# Altium footprint library andylib.PcbLib: 158 footprints (part 8 of 10)
Each footprint in its own frame and in the unit in brackets; x right, y up, seen from the top. Pads: shape width x height; smd on the part's side, far side on the other; paste and mask are expansions set on the pad; w line width, h text height; cw(c..) or ccw(c..) is an arc to the next point about the centre after c.
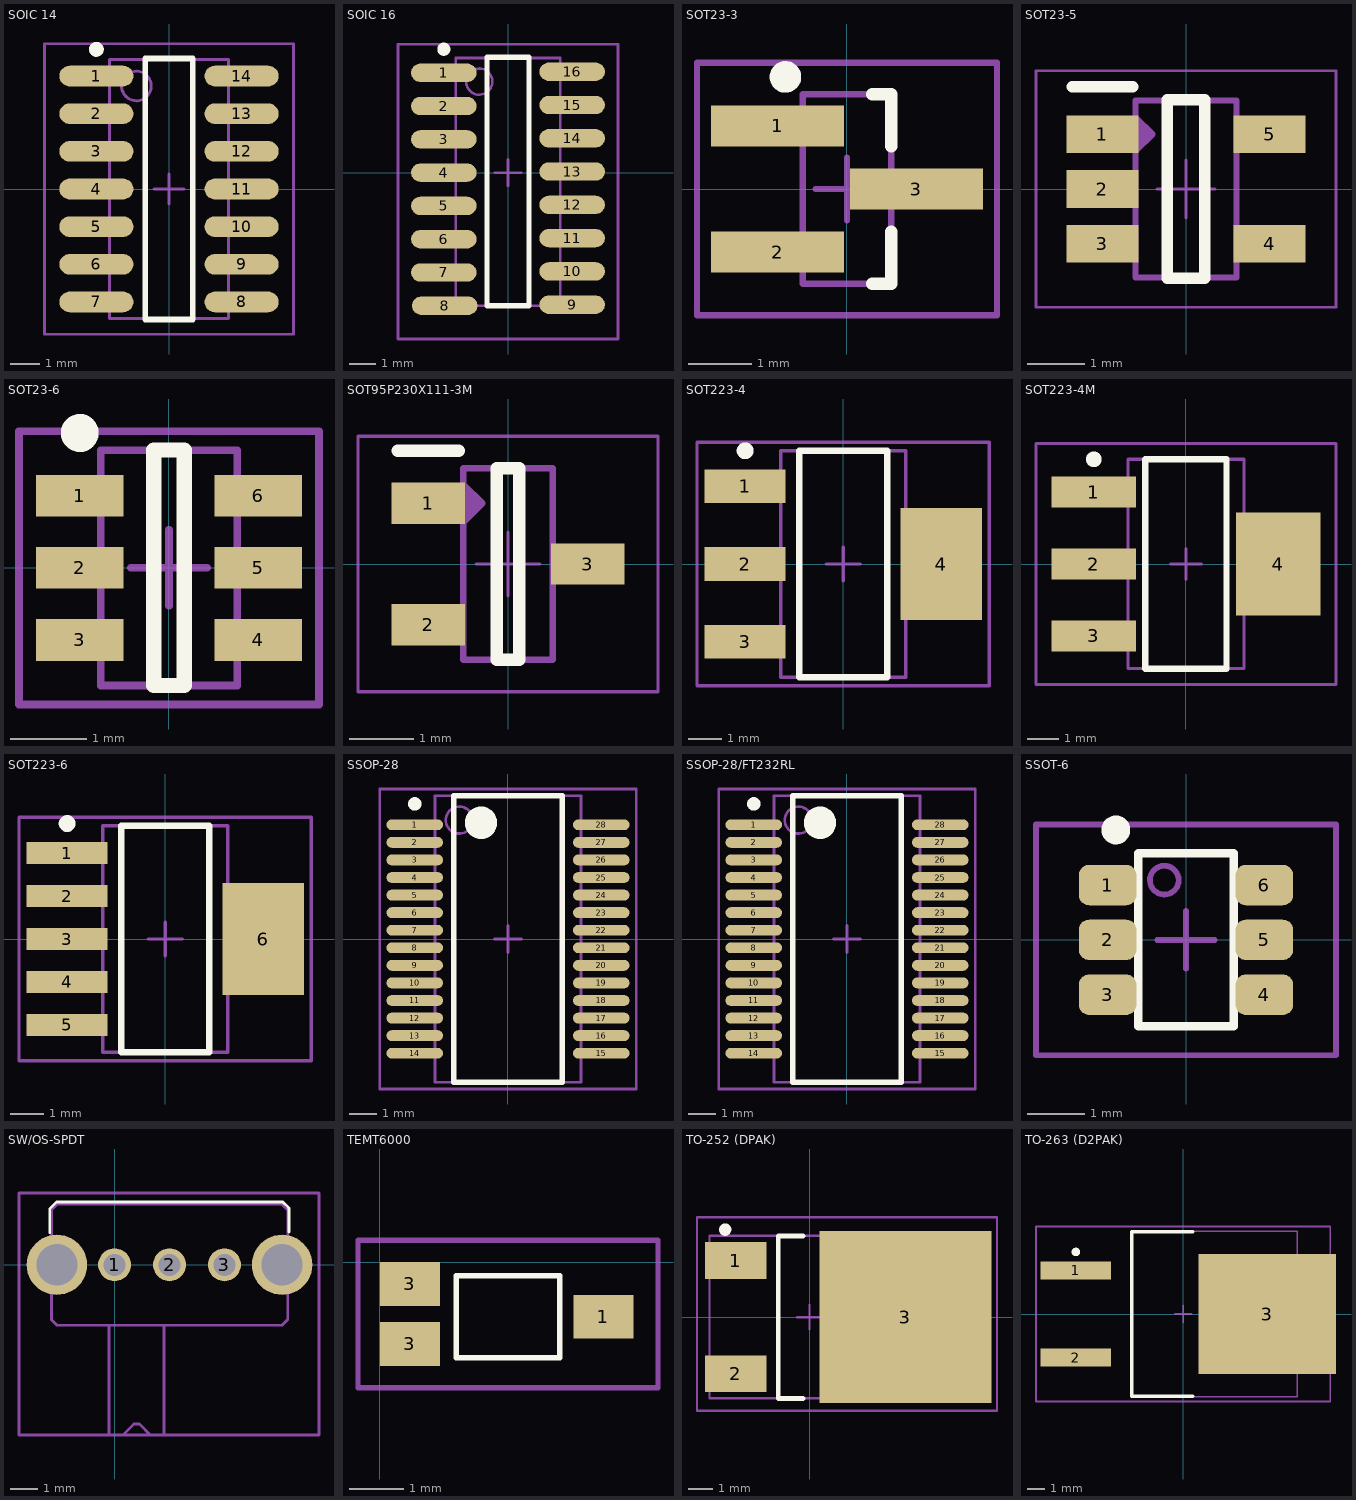
[diagram p7: the footprints below, top view; thin cyan lines are the x and y axes]

## SOIC 14 [mm] "14-Pin Small Outline Integrated Circuit 1.27 mm Pitch, IPC Low Density"
height 1.75
pads (14):
  oval 2.5x0.7 smd: 1(-2.45,3.81) 2(-2.45,2.54) 3(-2.45,1.27) 4(-2.45,0) 5(-2.45,-1.27) 6(-2.45,-2.54) 7(-2.45,-3.81) 8(2.45,-3.81) 9(2.45,-2.54) 10(2.45,-1.27) 11(2.45,0) 12(2.45,1.27) 13(2.45,2.54) 14(2.45,3.81)
Top Overlay:
  circle w0.25: c-2.45,4.71 r0.125
  lines w0.2: -0.8,-4.4 -0.8,4.4 0.8,4.4 0.8,-4.4 -0.8,-4.4
Mechanical 13:
  circle w0.1: c-1.1,3.475 r0.5
  lines w0.1: -2,-4.375 -2,4.375 2,4.375 2,-4.375 -2,-4.375
Mechanical 15:
  lines w0.1: -0.5,0 0.5,0 ; 0,-0.5 0,0.5 ; -4.2,-4.9 -4.2,4.9 4.2,4.9 4.2,-4.9 -4.2,-4.9
3D body: height 1.75, standoff 0, extent -3.048,-4.318 3.054,4.332

## SOIC 16 [mm] "14-Pin Small Outline Integrated Circuit 1.27 mm Pitch, IPC Low Density"
height 1.75
pads (16):
  oval 2.5x0.7 smd: 1(-2.45,3.81) 2(-2.45,2.54) 3(-2.45,1.27) 4(-2.45,0) 5(-2.45,-1.27) 6(-2.45,-2.54) 7(-2.45,-3.81) 8(-2.413,-5.08) 9(2.45,-5.04) 10(2.45,-3.77) 11(2.45,-2.5) 12(2.45,-1.23) 13(2.45,0.04) 14(2.45,1.31) 15(2.45,2.58) 16(2.45,3.85)
Top Overlay:
  circle w0.25: c-2.45,4.71 r0.125
  lines w0.2: -0.8,-5.08 -0.8,4.4 0.8,4.4 0.8,-5.08 -0.8,-5.08
Mechanical 13:
  circle w0.1: c-1.1,3.475 r0.5
  lines w0.1: -2,-5.08 -2,4.375 2,4.375 2,-5.08 -2,-5.08
Mechanical 15:
  lines w0.1: -0.5,0 0.5,0 ; 0,-0.5 0,0.5 ; -4.2,-6.35 -4.2,4.9 4.2,4.9 4.2,-6.35 -4.2,-6.35
3D body: height 1.75, standoff 0, extent -3.048,-4.318 3.054,4.332

## SOT23-3 [mm] "SOT23, 3-Leads, Body 3.0x2.6mm (max), Pitch 0.95mm, IPC Low Density"
height 1.1
pads (3):
  rect 2.1x0.65 smd: 1(-1.1,1) 2(-1.1,-1) 3(1.1,0)
Top Overlay:
  circle w0.25: c-0.975,1.775 r0.125
  lines w0.2: 0.4,-1.5 0.7,-1.5 0.7,-0.675 ; 0.4,1.5 0.7,1.5 0.7,0.675
Mechanical 13:
  lines w0.1: -0.7,-1.5 -0.7,1.5 0.7,1.5 0.7,-1.5 -0.7,-1.5
Mechanical 15:
  lines w0.1: -0.5,0 0.5,0 ; 0,-0.5 0,0.5 ; -2.375,-2 -2.375,2 2.375,2 2.375,-2 -2.375,-2
3D body: height 1.46, standoff 0, extent -1.575,-1.501 1.422,1.499

## SOT23-5 [mm] "SOT23, 5-Leads, Body 3.1x3.0mm (max), Pitch 0.95mm, IPC Low Density"
height 1
pads (5):
  rect 1.25x0.65 smd: 1(-1.45,0.95) 2(-1.45,0) 3(-1.45,-0.95) 4(1.45,-0.95) 5(1.45,0.95)
Top Overlay:
  lines w0.2: -1.975,1.775 -0.925,1.775 ; -0.325,-1.55 -0.325,1.55 0.325,1.55 0.325,-1.55 -0.325,-1.55
Mechanical 13:
  lines w0.1: -0.875,0.65 -0.575,0.95 -0.875,1.25 ; -0.875,0.75 -0.675,0.95 -0.875,1.15 ; -0.875,0.85 -0.775,0.95 -0.875,1.05 ; -0.875,-1.535 0.875,-1.535 0.875,1.535 -0.875,1.535 -0.875,-1.535
  text ".Designator" at 0.175,-0.85 h0.5
Mechanical 15:
  lines w0.05: -0.5,0 0.5,0 ; 0,-0.5 0,0.5 ; -2.6,-2.05 2.6,-2.05 2.6,2.05 -2.6,2.05 -2.6,-2.05
3D body: height 1.1, standoff 0, extent -1.25,-1.5 1.25,1.5

## SOT23-6 [mm] "SOT23, 6-Leads, Body 3.1x3.2mm (max), Pitch 0.95mm, IPC Medium Density"
height 1.45
pads (6):
  rect 1.15x0.55 smd: 1(-1.175,0.95) 2(-1.175,0) 3(-1.175,-0.95) 4(1.175,-0.95) 5(1.175,0) 6(1.175,0.95)
Top Overlay:
  circle w0.25: c-1.175,1.775 r0.125
  lines w0.2: -0.2,-1.55 0.2,-1.55 0.2,1.55 -0.2,1.55 -0.2,-1.55
Mechanical 13:
  lines w0.1: -0.9,-1.55 -0.9,1.55 0.9,1.55 0.9,-1.55 -0.9,-1.55
Mechanical 15:
  lines w0.1: -0.5,0 0.5,0 ; 0,-0.5 0,0.5 ; -1.975,-1.8 -1.975,1.8 1.975,1.8 1.975,-1.8 -1.975,-1.8
3D body: height 1.3, standoff 0, extent -1.499,-1.5 1.501,1.5

## SOT95P230X111-3M [mm] "SOT23, 3-Leads, Body 3.0x2.5mm (max), Pitch 0.95mm, IPC Low Density"
height 1.11
pads (3):
  rect 1.15x0.65 smd: 1(-1.25,0.95) 2(-1.25,-0.95) 3(1.25,0)
Top Overlay:
  lines w0.2: -1.725,1.775 -0.775,1.775 ; -0.175,-1.5 -0.175,1.5 0.175,1.5 0.175,-1.5 -0.175,-1.5
Mechanical 13:
  lines w0.1: -0.7,0.65 -0.4,0.95 -0.7,1.25 ; -0.7,0.75 -0.5,0.95 -0.7,1.15 ; -0.7,0.85 -0.6,0.95 -0.7,1.05 ; -0.7,-1.5 0.7,-1.5 0.7,1.5 -0.7,1.5 -0.7,-1.5
  text ".Designator" at 0.254,-0.635 h0.5
Mechanical 15:
  lines w0.05: -0.5,0 0.5,0 ; 0,-0.5 0,0.5 ; -2.35,-2 -2.35,2 2.35,2 2.35,-2 -2.35,-2
3D body: height 1, standoff 0, extent -1.2,-1.448 1.22,1.448

## SOT223-4 [mm] "SOT223, 4-Leads, Body 6.7x7.3mm (max), Pitch 2.30mm, IPC Medium Density"
height 1.8
pads (4):
  rect 2.4x1 smd: 1(-2.9,2.3) 2(-2.9,0) 3(-2.9,-2.3)
  rect 2.4x3.3 smd: 4(2.9,0)
Top Overlay:
  circle w0.25: c-2.9,3.35 r0.125
  lines w0.2: -1.3,-3.35 1.3,-3.35 1.3,3.35 -1.3,3.35 -1.3,-3.35
Mechanical 13:
  lines w0.1: -1.85,-3.35 1.85,-3.35 1.85,3.35 -1.85,3.35 -1.85,-3.35
Mechanical 15:
  lines w0.1: -0.5,0 0.5,0 ; 0,-0.5 0,0.5 ; -4.325,-3.6 4.325,-3.6 4.325,3.6 -4.325,3.6 -4.325,-3.6
3D body: height 1.64, standoff -0.01, extent -3.454,-3.225 3.546,3.275

## SOT223-4M [mm] "SOT223, 4-Leads, Body 6.5x3.5mm, Pitch 2.3mm, Lead Span 7mm, IPC Low Density"
height 1.7
pads (4):
  rect 2.7x1 smd: 1(-2.95,2.3) 2(-2.95,0) 3(-2.95,-2.3)
  rect 2.7x3.3 smd: 4(2.95,0)
Top Overlay:
  circle w0.25: c-2.95,3.35 r0.125
  lines w0.2: -1.3,-3.35 -1.3,3.35 1.3,3.35 1.3,-3.35 -1.3,-3.35
Mechanical 13:
  lines w0.1: -1.85,-3.35 -1.85,3.35 1.85,3.35 1.85,-3.35 -1.85,-3.35
Mechanical 15:
  lines w0.1: -0.5,0 0.5,0 ; 0,-0.5 0,0.5 ; -4.8,-3.85 -4.8,3.85 4.8,3.85 4.8,-3.85 -4.8,-3.85
3D body: height 1.7, standoff 0, extent -3.495,-3.25 3.395,3.25

## SOT223-6 [mm] "SOT223, 6-Leads, Body 6.7x7.3mm (max), Pitch 1.27mm, IPC Medium Density"
height 1.8
pads (6):
  rect 2.4x0.65 smd: 1(-2.9,2.54) 2(-2.9,1.27) 3(-2.9,0) 4(-2.9,-1.27) 5(-2.9,-2.54)
  rect 2.4x3.3 smd: 6(2.9,0)
Top Overlay:
  circle w0.25: c-2.9,3.415 r0.125
  lines w0.2: -1.3,-3.35 1.3,-3.35 1.3,3.35 -1.3,3.35 -1.3,-3.35
Mechanical 13:
  lines w0.1: -1.85,-3.35 1.85,-3.35 1.85,3.35 -1.85,3.35 -1.85,-3.35
Mechanical 15:
  lines w0.1: -0.5,0 0.5,0 ; 0,-0.5 0,0.5 ; -4.325,-3.6 4.325,-3.6 4.325,3.6 -4.325,3.6 -4.325,-3.6
3D body: height 1.7, standoff 0, extent -3.455,-3.249 3.505,3.251

## SSOP-28 [mm] "28-Pin SSOP 0.65 mm Pitch"
height 2
pads (28):
  oval 2.1x0.4 smd: 1(-3.45,4.225) 2(-3.45,3.575) 3(-3.45,2.925) 4(-3.45,2.275) 5(-3.45,1.625) 6(-3.45,0.975) 7(-3.45,0.325) 8(-3.45,-0.325) 9(-3.45,-0.975) 10(-3.45,-1.625) 11(-3.45,-2.275) 12(-3.45,-2.925) 13(-3.45,-3.575) 14(-3.45,-4.225) 15(3.45,-4.225) 16(3.45,-3.575) 17(3.45,-2.925) 18(3.45,-2.275) 19(3.45,-1.625) 20(3.45,-0.975) 21(3.45,-0.325) 22(3.45,0.325) 23(3.45,0.975) 24(3.45,1.625) 25(3.45,2.275) 26(3.45,2.925) 27(3.45,3.575) 28(3.45,4.225)
Top Overlay:
  circle w0.6: c-1,4.3 r0.3
  circle w0.25: c-3.45,5 r0.125
  lines w0.2: -2,-5.3 2,-5.3 2,5.3 -2,5.3 -2,-5.3
Mechanical 13:
  circle w0.1: c-1.8,4.4 r0.5
  lines w0.1: -2.7,-5.3 2.7,-5.3 2.7,5.3 -2.7,5.3 -2.7,-5.3
Mechanical 15:
  lines w0.1: -0.5,0 0.5,0 ; 0,-0.5 0,0.5 ; -4.75,-5.55 4.75,-5.55 4.75,5.55 -4.75,5.55 -4.75,-5.55
3D body: height 2.15, standoff 0, extent -3.827,-5.165 3.929,5.165

## SSOP-28/FT232RL [mm] "28-Pin SSOP 0.65 mm Pitch"
height 2
pads (28):
  oval 2.1x0.4 smd: 1(-3.45,4.225) 2(-3.45,3.575) 3(-3.45,2.925) 4(-3.45,2.275) 5(-3.45,1.625) 6(-3.45,0.975) 7(-3.45,0.325) 8(-3.45,-0.325) 9(-3.45,-0.975) 10(-3.45,-1.625) 11(-3.45,-2.275) 12(-3.45,-2.925) 13(-3.45,-3.575) 14(-3.45,-4.225) 15(3.45,-4.225) 16(3.45,-3.575) 17(3.45,-2.925) 18(3.45,-2.275) 19(3.45,-1.625) 20(3.45,-0.975) 21(3.45,-0.325) 22(3.45,0.325) 23(3.45,0.975) 24(3.45,1.625) 25(3.45,2.275) 26(3.45,2.925) 27(3.45,3.575) 28(3.45,4.225)
Top Overlay:
  circle w0.25: c-3.45,5 r0.125
  circle w0.6: c-1,4.3 r0.3
  lines w0.2: -2,-5.3 -2,5.3 2,5.3 2,-5.3 -2,-5.3
Mechanical 13:
  circle w0.1: c-1.8,4.4 r0.5
  lines w0.1: -2.7,-5.3 -2.7,5.3 2.7,5.3 2.7,-5.3 -2.7,-5.3
Mechanical 15:
  lines w0.1: -0.5,0 0.5,0 ; 0,-0.5 0,0.5 ; -4.75,-5.55 -4.75,5.55 4.75,5.55 4.75,-5.55 -4.75,-5.55
3D body: height 2.16, standoff 0, extent -3.827,-5.165 3.929,5.165

## SSOT-6 [mm] "TSOP, 6-Leads, Body 3.0x1.7mm (max), Pitch 0.95mm, IPC Low Density"
height 1
pads (6):
  rrect50% 1x0.7 smd: 1(-1.358,0.95) 2(-1.358,0) 3(-1.358,-0.95) 4(1.358,-0.95) 5(1.358,0) 6(1.358,0.95)
Top Overlay:
  circle w0.25: c-1.217,1.905 r0.125
  lines w0.15: -0.825,-1.5 0.825,-1.5 0.825,1.5 -0.825,1.5 -0.825,-1.5
Mechanical 13:
  lines w0.1: -0.127,1.033 cw(c-0.376,1.035) -0.127,1.041 ; -0.85,-1.5 0.85,-1.5 0.85,1.5 -0.85,1.5 -0.85,-1.5
Mechanical 15:
  lines w0.1: -0.5,0 0.5,0 ; 0,-0.5 0,0.5 ; -2.6,-2 2.6,-2 2.6,2 -2.6,2 -2.6,-2
3D body: height 1, standoff 0.1, extent -0.85,-1.5 0.85,1.5

## SW/OS-SPDT [mm] "OS102011MA1QS1"
pads (5):
  round 1.2 hole 0.8: 1(0,0) 2(2,0) 3(4,0)
  round 2.2 hole 1.5: ""(-2.1,0) ""(6.1,0)
Top Overlay:
  lines w0.1: -2.362,1.168 -2.362,2.032 -2.108,2.286 6.121,2.286 6.325,2.083 ; 6.35,1.194 6.35,2.057
Mechanical 13:
  lines w0.1: -0.2,-2.2 -0.2,-6.2 0.3,-6.2 0.7,-5.8 0.9,-5.8 1.3,-6.2 1.8,-6.2 1.8,-2.2 ; -2.3,-2 -2.3,2 -2.1,2.2 6.1,2.2 6.3,2 6.3,-2 6.1,-2.2 -2.1,-2.2 -2.3,-2
Mechanical 15:
  lines w0.1: -3.48,-6.198 7.442,-6.198 7.442,2.616 -3.48,2.616 -3.48,-6.198
3D body: height 4.7, standoff -2.79, extent -2.324,-6.163 6.286,2.21

## TEMT6000 [mm] "Ambient Light Phototransistor - 1206"
pads (3):
  rect 1.1x0.8 all layers, no hole: 1(4.1,-1) 3(0.55,-1.5) 3(0.55,-0.4)
Top Overlay:
  lines w0.1: 1.4,-1.75 3.3,-1.75 3.3,-0.25 1.4,-0.25 1.4,-1.75
Mechanical 15:
  lines w0.1: -0.4,-2.3 5.1,-2.3 5.1,0.4 -0.4,0.4 -0.4,-2.3
3D body: height 1.11, standoff -0.4, extent 0.7,-1.8 3.9,-0.2

## TO-252 (DPAK) [mm] "D-PAK, 3-Pads, Body 9.6x9.6mm (max), IPC Medium Density"
height 2.38
pads (3):
  rect 2.5x1.5 smd: 1(-3,2.3) 2(-3,-2.3)
  rect 7x7 smd: 3(3.9,0)
Top Overlay:
  circle w0.25: c-3.427,3.556 r0.125
  lines w0.2: -0.254,-3.302 -1.27,-3.302 -1.27,3.302 -0.254,3.302
Mechanical 13:
  lines w0.1: -4.064,-3.302 -4.064,3.302 6.096,3.302 6.096,-3.302 -4.064,-3.302
Mechanical 15:
  lines w0.1: -0.5,0 0.5,0 ; 0,-0.5 0,0.5 ; -4.572,-3.81 -4.572,4.064 7.62,4.064 7.62,-3.81 -4.572,-3.81
3D body: height 2.41, standoff 0, extent -3.95,-3.27 5.988,3.27

## TO-263 (D2PAK) [mm] "D2-PAK, 3-Pads, Body 9.6x9.6mm (max), IPC Medium Density"
height 2.38
pads (3):
  rect 4.1x1.05 smd: 1(-6.25,2.54) 2(-6.25,-2.54)
  rect 8x7 smd: 3(4.902,0)
Top Overlay:
  circle w0.25: c-6.25,3.615 r0.125
  lines w0.2: 0.55,-4.8 -3,-4.8 -3,4.8 0.55,4.8
Mechanical 13:
  lines w0.1: -3,-4.825 -3,4.825 6.65,4.825 6.65,-4.825 -3,-4.825
Mechanical 15:
  lines w0.1: -0.5,0 0.5,0 ; 0,-0.5 0,0.5 ; -8.575,-5.1 -8.575,5.1 8.575,5.1 8.575,-5.1 -8.575,-5.1
3D body: height 4.98, standoff -0.03, extent -7.556,-5.08 7.708,5.08